# Altium footprint library STM32F407.PcbLib: 54 footprints (part 3 of 4)
Each footprint in its own frame and in the unit in brackets; x right, y up, seen from the top. Pads: shape width x height; smd on the part's side, far side on the other; paste and mask are expansions set on the pad; w line width, h text height; cw(c..) or ccw(c..) is an arc to the next point about the centre after c.
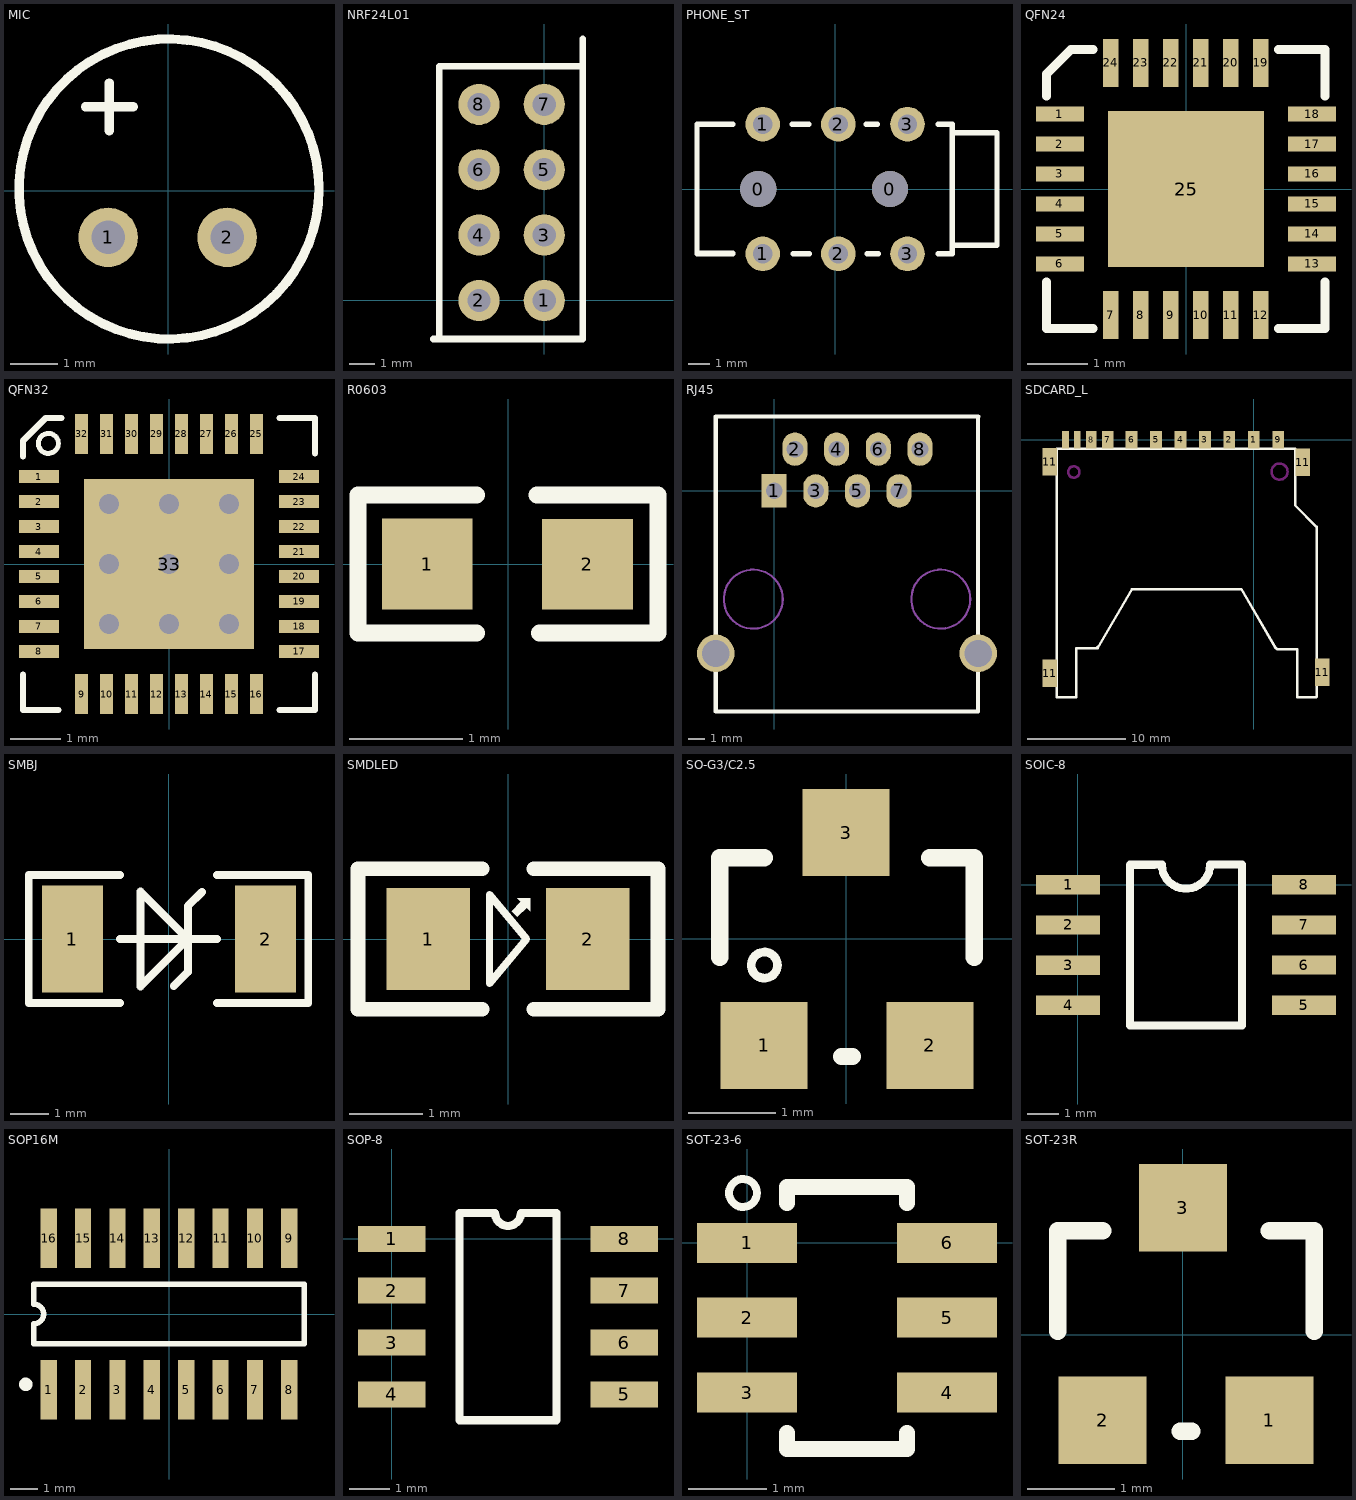
[diagram p2: the footprints below, top view; thin cyan lines are the x and y axes]

## MIC [mm]
pads (2):
  round 1.27 hole 0.711: 1(-1.285,-1) 2(1.255,-1)
Top Overlay:
  circle w0.2: c0.015,0.033 r3.2
  lines w0.2: -1.767,1.785 -0.751,1.785 ; -1.259,1.277 -1.259,2.293

## NRF24L01 [mm]
pads (8):
  round 1.6 hole 0.9: 1(0,0) 2(-2.54,0) 3(0,2.54) 4(-2.54,2.54) 5(0,5.08) 6(-2.54,5.08) 7(0,7.62) 8(-2.54,7.62)
Top Overlay:
  lines w0.254: -4.318,-1.5 -4.089,-1.5 ; 1.5,9.093 -4.089,9.093 -4.089,-1.5 ; 1.5,10.16 1.5,-1.5 -4.089,-1.5
3D body "User Library-BL1-004-S842-55.step": height 8.42, standoff -3.2, extent -1.27,-1.52 1.27,9.14
3D body "User Library-BL1-004-S842-55.step": height 8.42, standoff -3.2, extent -3.81,-1.52 -1.27,9.14

## PHONE_ST [mm]
pads (8):
  round 1.676 hole 1.676: 0(-3.556,0) 0(2.54,0)
  round 1.6 hole 0.9: 1(-3.35,-3) 1(-3.35,3) 2(0.15,-3) 2(0.15,3) 3(3.35,-3) 3(3.35,3)
Top Overlay:
  lines w0.254: -6.393,-2.969 -4.742,-2.969 ; -4.742,-3.007 -6.393,-3.007 -6.393,3 -4.742,3 ; -1.986,3 -1.224,3 ; -1.948,-3.007 -1.186,-3.007 ; 1.443,3 1.951,3 ; 1.481,-3.007 1.989,-3.007 ; 4.783,-3.007 5.33,-3.007 ; 4.783,3 5.418,3 5.418,-3.007 ; 5.418,-2.6 7.493,-2.6 7.493,2.6 5.418,2.6
3D body "mj-2523-smt.stp": height 4.7, standoff -0.6, extent -6.375,-4 7.125,4

## QFN24 [mm]
pads (25):
  rect 0.8x0.254 smd: 1(-2.101,1.25) 2(-2.101,0.75) 3(-2.101,0.25) 4(-2.101,-0.25) 5(-2.101,-0.75) 6(-2.101,-1.25) 13(2.101,-1.25) 14(2.101,-0.75) 15(2.101,-0.25) 16(2.101,0.25) 17(2.101,0.75) 18(2.101,1.25)
  rect 0.254x0.8 smd: 7(-1.255,-2.101) 8(-0.755,-2.101) 9(-0.255,-2.101) 10(0.245,-2.101) 11(0.745,-2.101) 12(1.245,-2.101) 19(1.245,2.101) 20(0.745,2.101) 21(0.245,2.101) 22(-0.255,2.101) 23(-0.755,2.101) 24(-1.255,2.101)
  rect 2.6x2.6 smd: 25(0,0)
Top Overlay:
  lines w0.15: -2.33,-1.55 -2.33,-2.325 -1.555,-2.325 ; -2.33,1.55 -2.33,1.917 -1.921,2.325 -1.555,2.325 ; 1.545,-2.325 2.32,-2.325 2.32,-1.55 ; 1.545,2.325 2.32,2.325 2.32,1.55
3D body "QFN24.step": height 0.9, standoff 0, extent -2.002,-2.002 2.002,2.002

## QFN32 [mm]
pads (33):
  rect 0.8x0.254 smd: 1(-2.601,1.75) 2(-2.601,1.25) 3(-2.601,0.75) 4(-2.601,0.25) 5(-2.601,-0.25) 6(-2.601,-0.75) 7(-2.601,-1.25) 8(-2.601,-1.75) 17(2.601,-1.75) 18(2.601,-1.25) 19(2.601,-0.75) 20(2.601,-0.25) 21(2.601,0.25) 22(2.601,0.75) 23(2.601,1.25) 24(2.601,1.75)
  rect 0.254x0.8 smd: 9(-1.75,-2.601) 10(-1.25,-2.601) 11(-0.75,-2.601) 12(-0.25,-2.601) 13(0.25,-2.601) 14(0.75,-2.601) 15(1.25,-2.601) 16(1.75,-2.601) 25(1.75,2.601) 26(1.25,2.601) 27(0.75,2.601) 28(0.25,2.601) 29(-0.25,2.601) 30(-0.75,2.601) 31(-1.25,2.601) 32(-1.75,2.601)
  rect 3.4x3.4 smd: 33(0,0)
via 1.2,-1.2 diameter 0.7 hole 0.4
via 0,-1.2 diameter 0.7 hole 0.4
via -1.2,-1.2 diameter 0.7 hole 0.4
via 1.2,0 diameter 0.7 hole 0.4
via 0,0 diameter 0.7 hole 0.4
via -1.2,0 diameter 0.7 hole 0.4
via 1.2,1.2 diameter 0.7 hole 0.4
via 0,1.2 diameter 0.7 hole 0.4
via -1.2,1.2 diameter 0.7 hole 0.4
Top Overlay:
  circle w0.1: c-2.413,2.413 r0.2
  lines w0.127: -2.921,-2.21 -2.921,-2.921 -2.21,-2.921 ; -2.921,2.159 -2.921,2.464 -2.464,2.921 -2.159,2.921 ; 2.21,-2.921 2.921,-2.921 2.921,-2.21 ; 2.21,2.921 2.921,2.921 2.921,2.21
Mechanical 15:
  lines w0.1: -0.5,0 0.5,0 ; 0,-0.5 0,0.5
3D body "qfn32-5x5.step": height 0.8, standoff 0, extent -2.52,-2.51 2.5,2.51

## R0603 [mm]
pads (2):
  rect 0.8x0.8 smd: 1(-0.711,0) 2(0.699,-0.002)
Top Overlay:
  lines w0.15: -0.279,-0.61 -1.321,-0.61 -1.321,0.61 -0.279,0.61 ; 0.254,0.61 1.295,0.61 ; 0.279,-0.61 1.321,-0.61 1.321,0.61
3D body "User Library-RES_1609-0603.STEP": height 0.56, standoff 0, extent -0.85,-0.4 0.85,0.4

## RJ45 [mil]
height 30
pads (10):
  rect 60x80 hole 40: 1(0,0)
  oval 60x80 hole 40: 2(50,100) 3(100,0) 4(150,100) 5(200,0) 6(250,100) 7(300,0) 8(350,100)
  round 90 hole 65: ""(-140,-390) ""(490,-390)
Top Overlay:
  lines w10: -140.16,-530 489.76,-530 489.76,-129.92 489.76,178.5 ; -140,-530 -140.16,-529.84 -140.16,-129.92 -140.16,178.58 ; -140,178.74 -140.16,178.58 ; 490,178.74 489.76,178.5 ; -140.16,178.58 489.69,178.58 489.76,178.5
Mechanical 1:
  circle w5: c400,-260 r70.8
  circle w5: c-50,-260 r70.8

## SDCARD_L [mm]
pads (15):
  rect 1.2x1.8 smd: 1(0,0) 2(-2.489,0) 3(-4.983,-0.009) 4(-7.483,-0.009) 5(-9.983,-0.009) 6(-12.483,-0.009) 7(-14.908,-0.009) 9(2.517,-0.009)
  rect 1.1x1.8 smd: 8(-16.612,0)
  rect 0.7x1.8 smd: 10(-18.034,0) 12(-19.253,0)
  rect 1.5x2.8 smd: 11(-20.853,-23.851) 11(-20.853,-2.261) 11(5.004,-2.286) 11(7.01,-23.784)
Top Overlay:
  lines w0.254: -18.158,-21.3 -18.158,-26.3 -20.131,-26.3 -20.131,-0.914 -20.117,-0.9 4.242,-0.9 4.242,-6.71 6.431,-8.899 6.442,-8.899 6.442,-26.273 6.415,-26.3 4.442,-26.3 4.442,-21.402 2.4,-21.402 2.242,-21.244 ; -18.107,-21.294 -16.065,-21.294 -15.907,-21.136 ; -15.958,-21.294 -12.446,-15.3 ; -12.458,-15.3 -1.258,-15.3 2.242,-21.294
Keep-Out Layer:
  circle w0.254: c2.642,-3.26 r0.82
  circle w0.254: c-18.39,-3.3 r0.58
3D body "TF.step": height 1.9, standoff -2, extent -20.934,-26.34 7.041,-0.09

## SMBJ [mm]
pads (2):
  rect 1.6x2.8 smd: 1(-2.515,0) 2(2.54,0)
Top Overlay:
  lines w0.203: -1.27,-1.676 -3.658,-1.676 -3.658,1.676 -1.27,1.676 ; -1.27,0 1.27,0 ; -0.737,1.245 -0.737,-1.245 0.508,0 -0.724,1.232 ; 0.14,-1.232 0.508,-0.864 0.508,0.864 0.876,1.232 ; 1.27,-1.676 3.658,-1.676 3.658,1.676 1.27,1.676
3D body "User Library-S1G.STEP": height 2.12, standoff -0.02, extent -2.527,-1.333 2.578,1.334

## SMDLED [mil]
pads (2):
  rect 45x55 smd: 1(-43,0) 2(43,0)
Top Overlay:
  region: 2,15 7,20 5,22 12,22 12,15 10,17 5,12
  lines w3.94: -10,-24 10,0 -10,24 -10,-24
  lines w7.87: -14,-38 -81,-38 -81,38 -14,38 ; 14,-38 81,-38 81,38 14,38
3D body "led0805  green.step": height 43.31, standoff -0.5, extent -40,-25 40,25

## SO-G3/C2.5 [mm]
pads (3):
  rect 1x1 smd: 1(-0.943,-1.229) 2(0.962,-1.229) 3(0,1.219)
Top Overlay:
  circle w0.1: c-0.94,-0.305 r0.15
  lines w0.2: -1.451,-0.213 -1.451,0.93 -0.943,0.93 ; -0.054,-1.356 0.073,-1.356 ; 0.962,0.93 1.47,0.93 1.47,-0.213
3D body "sot23-3.STEP": height 1, standoff -0.02, extent -1.46,-1.194 1.46,1.282

## SOIC-8 [mil]
pads (8):
  rect 80x24 smd: 1(-11.81,0) 2(-11.81,-50.06) 3(-11.81,-100.06) 4(-11.81,-150.06) 5(281.81,-150) 6(281.81,-100) 7(281.81,-50) 8(281.81,0)
Top Overlay:
  lines w10: 75,24.94 75.06,25 105,25 ccw(c135,25) 165,25 204.94,25 205,24.94 205,-175.06 65,-175.06 65,24.94 95,24.94
3D body "SOIC8.STEP": height 90.55, standoff -0.78, extent -31.2,-181.9 299.21,29.91

## SOP16M [mm]
pads (16):
  rect 0.6x2.2 smd: 1(-4.445,-2.8) 2(-3.175,-2.8) 3(-1.905,-2.8) 4(-0.635,-2.8) 5(0.635,-2.8) 6(1.905,-2.8) 7(3.175,-2.8) 8(4.445,-2.8) 9(4.445,2.8) 10(3.175,2.8) 11(1.905,2.8) 12(0.635,2.8) 13(-0.635,2.8) 14(-1.905,2.8) 15(-3.175,2.8) 16(-4.445,2.8)
Top Overlay:
  circle w0.25: c-5.295,-2.6 r0.125
  lines w0.2: -5,-1.1 -5,-0.367 ccw(c-5,0) -5,0.367 -5,1.1 5,1.1 5,-1.1 -5,-1.1
3D body "SO-16.step": height 1.45, standoff 0, extent -5.004,-2.927 4.978,2.978

## SOP-8 [mil]
pads (8):
  rect 65x25 smd: 1(0,0) 2(0,-50) 3(0,-100) 4(0,-150) 5(224.41,-150) 6(224.41,-100) 7(224.41,-50) 8(224.41,0)
Top Overlay:
  lines w7.87: 65.37,-175 159.04,-175 159.04,25 124.7,25 cw(c112.2,25) 99.7,25 65.37,25 65.37,-175
3D body "SOP8.STEP": height 62.99, standoff 0, extent -7.7,-172.62 230.17,25.02

## SOT-23-6 [mil]
pads (6):
  rect 50x20 smd: 1(0,0) 2(0,-37.4) 3(0,-74.8) 4(100,-74.8) 5(100,-37.4) 6(100,0)
Top Overlay:
  circle w3.94: c-2,24.97 r6.97
  lines w8: 20,-95 20,-103 80,-103 80,-95 ; 20,20 20,28 80,28 80,20
3D body "User Library-SOT-23-6.STEP": height 42.61, standoff -0.39, extent -0.5,-93 95,17

## SOT-23R [mm]
pads (3):
  rect 1x1 smd: 1(0.988,-0.975) 2(-0.917,-0.975) 3(0,1.448)
Top Overlay:
  lines w0.2: -1.425,0.041 -1.425,1.184 -0.917,1.184 ; -0.028,-1.102 0.099,-1.102 ; 0.988,1.184 1.496,1.184 1.496,0.041
3D body "SOT-23-3.STEP": height 1.2, standoff 0, extent -1.425,-1.146 1.475,1.654